# Altium integrated library 兰格封装.IntLib: 1176 symbols (part 1 of 6) (continued)
## GD32F103R (continued)

## GD32F303R
designator U*
LQFP64; 单位: ֻ; 仓库名称: 元件仓; 加工方式: 贴片; 物料名称: GD32F303R; 物料代码: *; 规格型号: *; 助记码: *; 备注: *
footprint LQFP  64
pins: 1 V_BAT, 2 PC13/TAMPER/RTC, 3 PC14/OSC32_IN, 4 PC15/OSC32_OUT, 5 PD0/OSC_IN, 6 PD1/OSC_OUT, 7 NRST, 8 PC0/ADC012_IN10, 9 PC1/ADC012_IN11, 10 PC2/ADC012_IN12, 11 PC3/ADC012_IN13, 12 V_ssa, 13 V_dda, 14 PA0/WKUP/USART1_CTS/ADC012_IN0/TIMER1_CH0_ETI/TIMER4_CH0/TIMER7_ETI, 15 PA1/USART1_RTS/ADC012_IN1/TIMER1_CH1_ETI/TIMER4_CH1, 16 PA2/USART1_TX/ADC012_IN2/TIMER1_CH2/TIMER4_CH2/TIMER8_CH0/SPIO_IO2, 17 PA3/USART1_RX/ADC012_IN3/TIMER1_CH3/TIMER4_CH3/TIMER8_CH1/SPIO_IO3, 18 Vss4, 19 Vdd4, 20 PA4, 21 PA5/SPIO_SCK/ADC01_IN5/DAC_OUT1, 22 PA6/SPI0_MISO/ADC01_IN6/TIMER2_CH0/TIMER7_BKM/TIMER12_CH0/TIMER0_BKIN, 23 PA7/SPIO_MOSI/ADC01_IN7/TIMER2_CH1/TIMER7_CH0_ON/TIMER13_CH0/TIMER0_CH0_ON, 24 PC4/ADC01_IN14, 25 PC5/ADC01_IN15, 26 PB0/ADC01_IN8/TIMER2_CH2/TIMER7_CH1_ON/TIMER0_CH1_ON, 27 PB1/ADC01_IN9/TIMER2_CH3/TIMER7_CH2_ON/TIMER0_CH2_ON, 28 PB2/BOOT1, 29 PB10/I2C1_SCL/USART2_TX/TIMER1_CH2, 30 PB11/I2C1_SDA/USART2_RX/TIMER1_CH3, 31 Vss, 32 Vdd, 33 PB12/SPI1_NSS/I2C1_SMBA/USART2_CK/TIMER0_BKIN/I2S1_WS, 34 PB13/SPI1_SCK/USART2_CTS/TIMER0_CH0_ON/I2C1_CK, 35 PB14/SPI1_MISO/USART2_RTS/TIMER0_CH1_ON/TIMER11_CH0, 36 PB15/SPI1_MOSI/TIMER0_CH2_ON/I2C1_SD/TIMER11_CH1, 37 PC6/I2C1_MCK/TIMER7_CH0/SDIO_D6/TIMER2_CH0, 38 PC7/I2C2_MCK/TIMER7_CH1/SDIO_D7/TIMER2_CH1, 39 PC8/TIMER7_CH2/SDIO_D0/TIMER2_CH2, 40 PC9/TIMER7_CH3/SDIO_D1/TIMER2_CH3, 41 PA8/USART0_CK/TIMER0_CH0/CK_OUT0/VCORE/CTC_SYNC, 42 PA9/USART0_TX/TIMER0_CH1, 43 PA10/USART0_RX/TIMER0_CH2, 44 PA11/USART0_CTS/CAN0_RX/USBDM/TIMER0_CH3, 45 PA12/USART0_RTS/CAN0_TX/TIMER0_ETI/USBDP, 46 PA13/JTMS/SWDIO, 47 Vss_2, 48 Vdd_2, 49 PA14/JTCK/SWCLK, 50 PA15/JTDI/SPI2_NSS/I2S2_WS/TIMER1_CH0_ETI/PA15/SPIO_NSS, 51 PC10/USART3_TX/SDIO_D2/USART2_TX/SPI2_SCK/I2S2_CK, 52 PC11/UART3_RX/SDIO_D3/USART2_RX/SPI2_MISO, 53 PC12/UART4_TX/SDIO_CK, 54 PD2/TIMER2_ETI/SDIO_CMD/UART4_RX, 55 PB3/JTDO/SPI2_SCK/I2S2_CK/TRACESWO/TIMER1_CH1/SPI0_SCK, 56 PB4/NJTRST/SPI2_MISO/TIMER2_CH0/SPI0_MISO, 57 PB5/I2C0_SMBA/SPI2_MOSI/I2S2_SD/TIMER2_CH1/SPI0_MOSI, 58 PB6/I2C0_SCL/TIMER3_CH0/USART0_TX/SPI0_IO2, 59 PB7/I2C0_SDA/TIMER3_CH1/EXMC_NADV/USART0_RX/SPI0_IO3, 60 BOOT0, 61 PB8/TIMER3_CH2/SDIO_D4/TIMER9_CH0/I2C0_SCL/CAN0_RX, 62 PB9/TIMER3_CH3/SDIO_D5/TIMER10_CH0/I2C0_SDA/CAN0_TX, 63 Vss_3, 64 Vdd_3

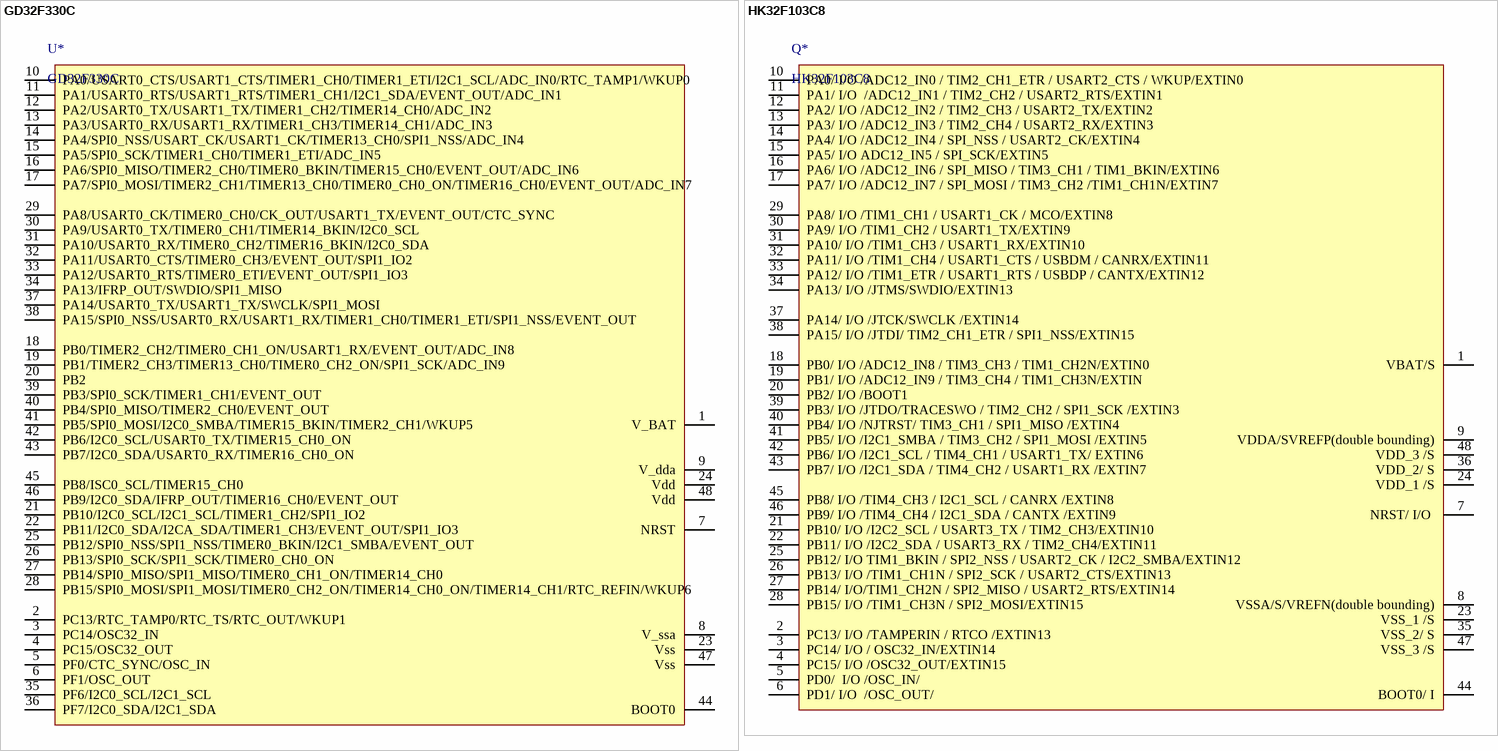
[diagram p4: symbols GD32F330C to HK32F103C8]

## GD32F330C
designator U*
LQFP48; 仓库名称: 元件仓; 单位: ֻ; 加工方式: 贴片; 物料名称: GD32F330C; 物料代码: *; 规格型号: *; 助记码: *; 备注: *
footprint LQFP  48
pins: 1 V_BAT, 2 PC13/RTC_TAMP0/RTC_TS/RTC_OUT/WKUP1, 3 PC14/OSC32_IN, 4 PC15/OSC32_OUT, 5 PF0/CTC_SYNC/OSC_IN, 6 PF1/OSC_OUT, 7 NRST, 8 V_ssa, 9 V_dda, 10 PA0/USART0_CTS/USART1_CTS/TIMER1_CH0/TIMER1_ETI/I2C1_SCL/ADC_IN0/RTC_TAMP1/WKUP0, 11 PA1/USART0_RTS/USART1_RTS/TIMER1_CH1/I2C1_SDA/EVENT_OUT/ADC_IN1, 12 PA2/USART0_TX/USART1_TX/TIMER1_CH2/TIMER14_CH0/ADC_IN2, 13 PA3/USART0_RX/USART1_RX/TIMER1_CH3/TIMER14_CH1/ADC_IN3, 14 PA4/SPI0_NSS/USART_CK/USART1_CK/TIMER13_CH0/SPI1_NSS/ADC_IN4, 15 PA5/SPI0_SCK/TIMER1_CH0/TIMER1_ETI/ADC_IN5, 16 PA6/SPI0_MISO/TIMER2_CH0/TIMER0_BKIN/TIMER15_CH0/EVENT_OUT/ADC_IN6, 17 PA7/SPI0_MOSI/TIMER2_CH1/TIMER13_CH0/TIMER0_CH0_ON/TIMER16_CH0/EVENT_OUT/ADC_IN7, 18 PB0/TIMER2_CH2/TIMER0_CH1_ON/USART1_RX/EVENT_OUT/ADC_IN8, 19 PB1/TIMER2_CH3/TIMER13_CH0/TIMER0_CH2_ON/SPI1_SCK/ADC_IN9, 20 PB2, 21 PB10/I2C0_SCL/I2C1_SCL/TIMER1_CH2/SPI1_IO2, 22 PB11/I2C0_SDA/I2CA_SDA/TIMER1_CH3/EVENT_OUT/SPI1_IO3, 23 Vss, 24 Vdd, 25 PB12/SPI0_NSS/SPI1_NSS/TIMER0_BKIN/I2C1_SMBA/EVENT_OUT, 26 PB13/SPI0_SCK/SPI1_SCK/TIMER0_CH0_ON, 27 PB14/SPI0_MISO/SPI1_MISO/TIMER0_CH1_ON/TIMER14_CH0, 28 PB15/SPI0_MOSI/SPI1_MOSI/TIMER0_CH2_ON/TIMER14_CH0_ON/TIMER14_CH1/RTC_REFIN/WKUP6, 29 PA8/USART0_CK/TIMER0_CH0/CK_OUT/USART1_TX/EVENT_OUT/CTC_SYNC, 30 PA9/USART0_TX/TIMER0_CH1/TIMER14_BKIN/I2C0_SCL, 31 PA10/USART0_RX/TIMER0_CH2/TIMER16_BKIN/I2C0_SDA, 32 PA11/USART0_CTS/TIMER0_CH3/EVENT_OUT/SPI1_IO2, 33 PA12/USART0_RTS/TIMER0_ETI/EVENT_OUT/SPI1_IO3, 34 PA13/IFRP_OUT/SWDIO/SPI1_MISO, 35 PF6/I2C0_SCL/I2C1_SCL, 36 PF7/I2C0_SDA/I2C1_SDA, 37 PA14/USART0_TX/USART1_TX/SWCLK/SPI1_MOSI, 38 PA15/SPI0_NSS/USART0_RX/USART1_RX/TIMER1_CH0/TIMER1_ETI/SPI1_NSS/EVENT_OUT, 39 PB3/SPI0_SCK/TIMER1_CH1/EVENT_OUT, 40 PB4/SPI0_MISO/TIMER2_CH0/EVENT_OUT, 41 PB5/SPI0_MOSI/I2C0_SMBA/TIMER15_BKIN/TIMER2_CH1/WKUP5, 42 PB6/I2C0_SCL/USART0_TX/TIMER15_CH0_ON, 43 PB7/I2C0_SDA/USART0_RX/TIMER16_CH0_ON, 44 BOOT0, 45 PB8/ISC0_SCL/TIMER15_CH0, 46 PB9/I2C0_SDA/IFRP_OUT/TIMER16_CH0/EVENT_OUT, 47 Vss, 48 Vdd

## HK32F103C8
designator Q*
仓库名称: 元件仓; 单位: ֻ; 加工方式: 贴片; 物料名称: HK32F103C8; 物料代码: *; 助记码: *; 备注: *; 规格型号: *
footprint LQFP  48
pins: 1 VBAT/S, 2 PC13/ I/O /TAMPERIN / RTCO /EXTIN13, 3 PC14/ I/O / OSC32_IN/EXTIN14, 4 PC15/ I/O /OSC32_OUT/EXTIN15, 5 PD0/  I/O /OSC_IN/, 6 PD1/ I/O  /OSC_OUT/, 7 NRST/ I/O , 8 VSSA/S/VREFN(double bounding), 9 VDDA/SVREFP(double bounding), 10 PA0/ I/O /ADC12_IN0 / TIM2_CH1_ETR / USART2_CTS / WKUP/EXTIN0, 11 PA1/ I/O  /ADC12_IN1 / TIM2_CH2 / USART2_RTS/EXTIN1, 12 PA2/ I/O /ADC12_IN2 / TIM2_CH3 / USART2_TX/EXTIN2, 13 PA3/ I/O /ADC12_IN3 / TIM2_CH4 / USART2_RX/EXTIN3, 14 PA4/ I/O /ADC12_IN4 / SPI_NSS / USART2_CK/EXTIN4, 15 PA5/ I/O ADC12_IN5 / SPI_SCK/EXTIN5, 16 PA6/ I/O /ADC12_IN6 / SPI_MISO / TIM3_CH1 / TIM1_BKIN/EXTIN6, 17 PA7/ I/O /ADC12_IN7 / SPI_MOSI / TIM3_CH2 /TIM1_CH1N/EXTIN7, 18 PB0/ I/O /ADC12_IN8 / TIM3_CH3 / TIM1_CH2N/EXTIN0, 19 PB1/ I/O /ADC12_IN9 / TIM3_CH4 / TIM1_CH3N/EXTIN, 20 PB2/ I/O /BOOT1, 21 PB10/ I/O /I2C2_SCL / USART3_TX / TIM2_CH3/EXTIN10, 22 PB11/ I/O /I2C2_SDA / USART3_RX / TIM2_CH4/EXTIN11, 23 VSS_1 /S, 24 VDD_1 /S, 25 PB12/ I/O TIM1_BKIN / SPI2_NSS / USART2_CK / I2C2_SMBA/EXTIN12, 26 PB13/ I/O /TIM1_CH1N / SPI2_SCK / USART2_CTS/EXTIN13, 27 PB14/ I/O/TIM1_CH2N / SPI2_MISO / USART2_RTS/EXTIN14, 28 PB15/ I/O /TIM1_CH3N / SPI2_MOSI/EXTIN15, 29 PA8/ I/O /TIM1_CH1 / USART1_CK / MCO/EXTIN8, 30 PA9/ I/O /TIM1_CH2 / USART1_TX/EXTIN9, 31 PA10/ I/O /TIM1_CH3 / USART1_RX/EXTIN10, 32 PA11/ I/O /TIM1_CH4 / USART1_CTS / USBDM / CANRX/EXTIN11, 33 PA12/ I/O /TIM1_ETR / USART1_RTS / USBDP / CANTX/EXTIN12, 34 PA13/ I/O /JTMS/SWDIO/EXTIN13, 35 VSS_2/ S, 36 VDD_2/ S, 37 PA14/ I/O /JTCK/SWCLK /EXTIN14, 38 PA15/ I/O /JTDI/ TIM2_CH1_ETR / SPI1_NSS/EXTIN15, 39 PB3/ I/O /JTDO/TRACESWO / TIM2_CH2 / SPI1_SCK /EXTIN3, 40 PB4/ I/O /NJTRST/ TIM3_CH1 / SPI1_MISO /EXTIN4, 41 PB5/ I/O /I2C1_SMBA / TIM3_CH2 / SPI1_MOSI /EXTIN5, 42 PB6/ I/O /I2C1_SCL / TIM4_CH1 / USART1_TX/ EXTIN6, 43 PB7/ I/O /I2C1_SDA / TIM4_CH2 / USART1_RX /EXTIN7, 44 BOOT0/ I, 45 PB8/ I/O /TIM4_CH3 / I2C1_SCL / CANRX /EXTIN8, 46 PB9/ I/O /TIM4_CH4 / I2C1_SDA / CANTX /EXTIN9, 47  VSS_3 /S, 48 VDD_3 /S

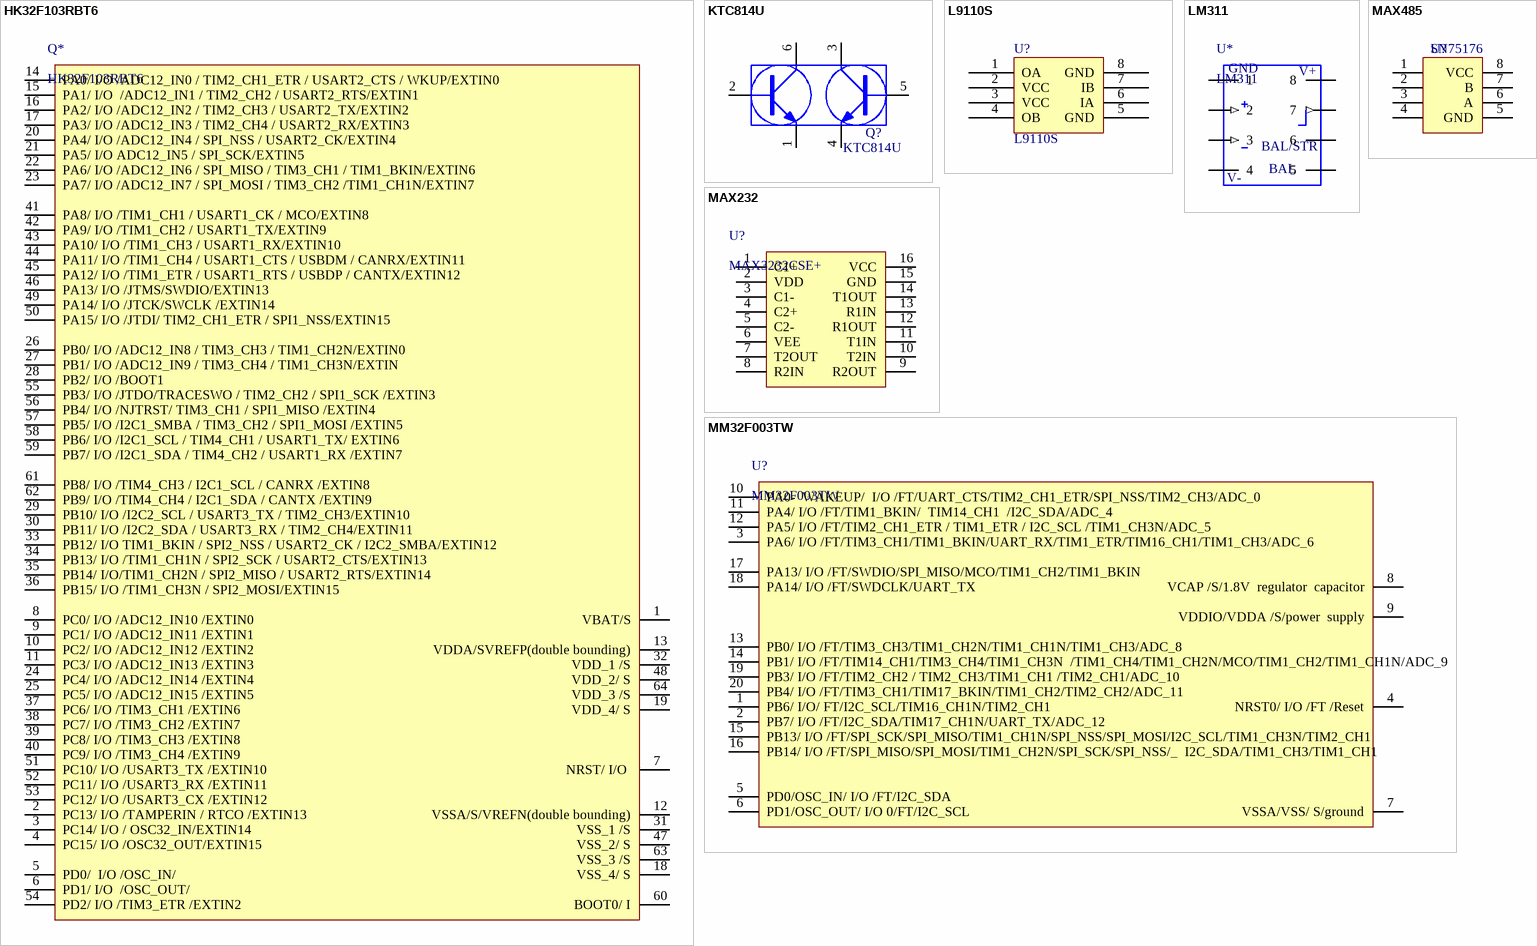
[diagram p5: symbols HK32F103RBT6 to MM32F003TW]

## HK32F103RBT6
designator Q*
单位: ֻ; 加工方式: 贴片; 仓库名称: 元件仓; 物料名称: HK32F103RBT6; 物料代码: *; 规格型号: *; 助记码: *
footprint LQFP  64
pins: 1 VBAT/S, 2 PC13/ I/O /TAMPERIN / RTCO /EXTIN13, 3 PC14/ I/O / OSC32_IN/EXTIN14, 4 PC15/ I/O /OSC32_OUT/EXTIN15, 5 PD0/  I/O /OSC_IN/, 6 PD1/ I/O  /OSC_OUT/, 7 NRST/ I/O , 8 PC0/ I/O /ADC12_IN10 /EXTIN0, 9 PC1/ I/O /ADC12_IN11 /EXTIN1, 10 PC2/ I/O /ADC12_IN12 /EXTIN2, 11 PC3/ I/O /ADC12_IN13 /EXTIN3, 12 VSSA/S/VREFN(double bounding), 13 VDDA/SVREFP(double bounding), 14 PA0/ I/O /ADC12_IN0 / TIM2_CH1_ETR / USART2_CTS / WKUP/EXTIN0, 15 PA1/ I/O  /ADC12_IN1 / TIM2_CH2 / USART2_RTS/EXTIN1, 16 PA2/ I/O /ADC12_IN2 / TIM2_CH3 / USART2_TX/EXTIN2, 17 PA3/ I/O /ADC12_IN3 / TIM2_CH4 / USART2_RX/EXTIN3, 18 VSS_4/ S, 19 VDD_4/ S, 20 PA4/ I/O /ADC12_IN4 / SPI_NSS / USART2_CK/EXTIN4, 21 PA5/ I/O ADC12_IN5 / SPI_SCK/EXTIN5, 22 PA6/ I/O /ADC12_IN6 / SPI_MISO / TIM3_CH1 / TIM1_BKIN/EXTIN6, 23 PA7/ I/O /ADC12_IN7 / SPI_MOSI / TIM3_CH2 /TIM1_CH1N/EXTIN7, 24 PC4/ I/O /ADC12_IN14 /EXTIN4, 25 PC5/ I/O /ADC12_IN15 /EXTIN5, 26 PB0/ I/O /ADC12_IN8 / TIM3_CH3 / TIM1_CH2N/EXTIN0, 27 PB1/ I/O /ADC12_IN9 / TIM3_CH4 / TIM1_CH3N/EXTIN, 28 PB2/ I/O /BOOT1, 29 PB10/ I/O /I2C2_SCL / USART3_TX / TIM2_CH3/EXTIN10, 30 PB11/ I/O /I2C2_SDA / USART3_RX / TIM2_CH4/EXTIN11, 31 VSS_1 /S, 32 VDD_1 /S, 33 PB12/ I/O TIM1_BKIN / SPI2_NSS / USART2_CK / I2C2_SMBA/EXTIN12, 34 PB13/ I/O /TIM1_CH1N / SPI2_SCK / USART2_CTS/EXTIN13, 35 PB14/ I/O/TIM1_CH2N / SPI2_MISO / USART2_RTS/EXTIN14, 36 PB15/ I/O /TIM1_CH3N / SPI2_MOSI/EXTIN15, 37 PC6/ I/O /TIM3_CH1 /EXTIN6, 38 PC7/ I/O /TIM3_CH2 /EXTIN7, 39 PC8/ I/O /TIM3_CH3 /EXTIN8, 40 PC9/ I/O /TIM3_CH4 /EXTIN9, 41 PA8/ I/O /TIM1_CH1 / USART1_CK / MCO/EXTIN8, 42 PA9/ I/O /TIM1_CH2 / USART1_TX/EXTIN9, 43 PA10/ I/O /TIM1_CH3 / USART1_RX/EXTIN10, 44 PA11/ I/O /TIM1_CH4 / USART1_CTS / USBDM / CANRX/EXTIN11, 45 PA12/ I/O /TIM1_ETR / USART1_RTS / USBDP / CANTX/EXTIN12, 46 PA13/ I/O /JTMS/SWDIO/EXTIN13, 47 VSS_2/ S, 48 VDD_2/ S, 49 PA14/ I/O /JTCK/SWCLK /EXTIN14, 50 PA15/ I/O /JTDI/ TIM2_CH1_ETR / SPI1_NSS/EXTIN15, 51 PC10/ I/O /USART3_TX /EXTIN10, 52 PC11/ I/O /USART3_RX /EXTIN11, 53 PC12/ I/O /USART3_CX /EXTIN12, 54 PD2/ I/O /TIM3_ETR /EXTIN2, 55 PB3/ I/O /JTDO/TRACESWO / TIM2_CH2 / SPI1_SCK /EXTIN3, 56 PB4/ I/O /NJTRST/ TIM3_CH1 / SPI1_MISO /EXTIN4, 57 PB5/ I/O /I2C1_SMBA / TIM3_CH2 / SPI1_MOSI /EXTIN5, 58 PB6/ I/O /I2C1_SCL / TIM4_CH1 / USART1_TX/ EXTIN6, 59 PB7/ I/O /I2C1_SDA / TIM4_CH2 / USART1_RX /EXTIN7, 60 BOOT0/ I, 61 PB8/ I/O /TIM4_CH3 / I2C1_SCL / CANRX /EXTIN8, 62 PB9/ I/O /TIM4_CH4 / I2C1_SDA / CANTX /EXTIN9, 63  VSS_3 /S, 64 VDD_3 /S

## KTC814U
designator Q?
仓库名称: 元件仓; 单位: ֻ; 物料名称: *; 物料代码: *; 助记码: *; 规格型号: *; 备注: *; 加工方式: *
footprint DFN-6 (SGM4157)
pins: 1 E, 2 B, 3 C, 4 E, 5 B, 6 C

## L9110S
designator U?
仓库名称: 元件仓; 单位: ֻ; 加工方式: 贴片; 物料代码: *; 物料名称: *; 助记码: *; 规格型号: *; 备注: *
footprint SOP 8
pins: 1 OA, 2 VCC, 3 VCC, 4 OB, 5 GND, 6 IA, 7 IB, 8 GND

## LM311
designator U*
LM311贴片IC; 物料代码: 3.01.04.02.0002; 助记码: LM311TPIC; 仓库名称: 元件仓; 单位: 个; 加工方式: 贴片; 物料名称: LM311贴片IC; 规格型号: *; 备注: *
footprint SOP 8
pins: 1, 2 (in), 3 (in), 4, 5 (hiz), 6 (hiz), 7 (out), 8 (power)
text: GND; V+; BAL/STR; BAL; V-

## MAX232
designator U?, comment MAX3232CSE+
MAX3232CSE+ 贴片IC; 物料代码: 3.01.04.02.0018; 规格型号: SOP-16; 助记码: MAX3232CSE+ TPIC; 仓库名称: 元件仓; 单位: ֻ; 加工方式: 贴片; 物料名称: MAX3232CSE+ 贴片IC
footprint SOP 16
pins: 1 C1+, 2 VDD (power), 3 C1-, 4 C2+, 5 C2-, 6 VEE (power), 7 T2OUT (power), 8 R2IN (oe), 9 R2OUT (oe), 10 T2IN (oe), 11 T1IN (oe), 12 R1OUT (oe), 13 R1IN (oe), 14 T1OUT (oe), 15 GND (power), 16 VCC (power)

## MAX485
designator U?, comment SN75176
SN75176BDR 贴片IC; 物料代码: 3.01.04.02.0071; 仓库名称: 元件仓; 助记码: SN75176BDR TPIC; 单位: ֻ; 规格型号: SOP-8; 加工方式: 贴片; 物料名称: SN75176BDR 贴片IC; 备注: *
footprint SOP 8
pins: 1, 2, 3, 4, 5 GND, 6 A, 7 B, 8 VCC

## MM32F003TW
designator U?
单位: ֻ; 仓库名称: 元件仓; 加工方式: 贴片; 物料名称: MM32F003TW; 物料代码: *; 规格型号: *; 助记码: *; 备注: *
footprint TSSOP 20
pins: 1 PB6/ I/O/ FT/I2C_SCL/TIM16_CH1N/TIM2_CH1, 2 PB7/ I/O /FT/I2C_SDA/TIM17_CH1N/UART_TX/ADC_12, 3 PA6/ I/O /FT/TIM3_CH1/TIM1_BKIN/UART_RX/TIM1_ETR/TIM16_CH1/TIM1_CH3/ADC_6, 4 NRST0/ I/O /FT /Reset, 5 PD0/OSC_IN/ I/O /FT/I2C_SDA, 6 PD1/OSC_OUT/ I/O 0/FT/I2C_SCL, 7 VSSA/VSS/ S/ground, 8 VCAP /S/1.8V  regulator  capacitor, 9 VDDIO/VDDA /S/power  supply, 10 PA0-  WAKEUP/  I/O /FT/UART_CTS/TIM2_CH1_ETR/SPI_NSS/TIM2_CH3/ADC_0, 11 PA4/ I/O /FT/TIM1_BKIN/  TIM14_CH1  /I2C_SDA/ADC_4, 12 PA5/ I/O /FT/TIM2_CH1_ETR / TIM1_ETR / I2C_SCL /TIM1_CH3N/ADC_5, 13 PB0/ I/O /FT/TIM3_CH3/TIM1_CH2N/TIM1_CH1N/TIM1_CH3/ADC_8, 14 PB1/ I/O /FT/TIM14_CH1/TIM3_CH4/TIM1_CH3N  /TIM1_CH4/TIM1_CH2N/MCO/TIM1_CH2/TIM1_CH1N/ADC_9, 15 PB13/ I/O /FT/SPI_SCK/SPI_MISO/TIM1_CH1N/SPI_NSS/SPI_MOSI/I2C_SCL/TIM1_CH3N/TIM2_CH1, 16 PB14/ I/O /FT/SPI_MISO/SPI_MOSI/TIM1_CH2N/SPI_SCK/SPI_NSS/_  I2C_SDA/TIM1_CH3/TIM1_CH1, 17 PA13/ I/O /FT/SWDIO/SPI_MISO/MCO/TIM1_CH2/TIM1_BKIN, 18 PA14/ I/O /FT/SWDCLK/UART_TX, 19 PB3/ I/O /FT/TIM2_CH2 / TIM2_CH3/TIM1_CH1 /TIM2_CH1/ADC_10, 20 PB4/ I/O /FT/TIM3_CH1/TIM17_BKIN/TIM1_CH2/TIM2_CH2/ADC_11

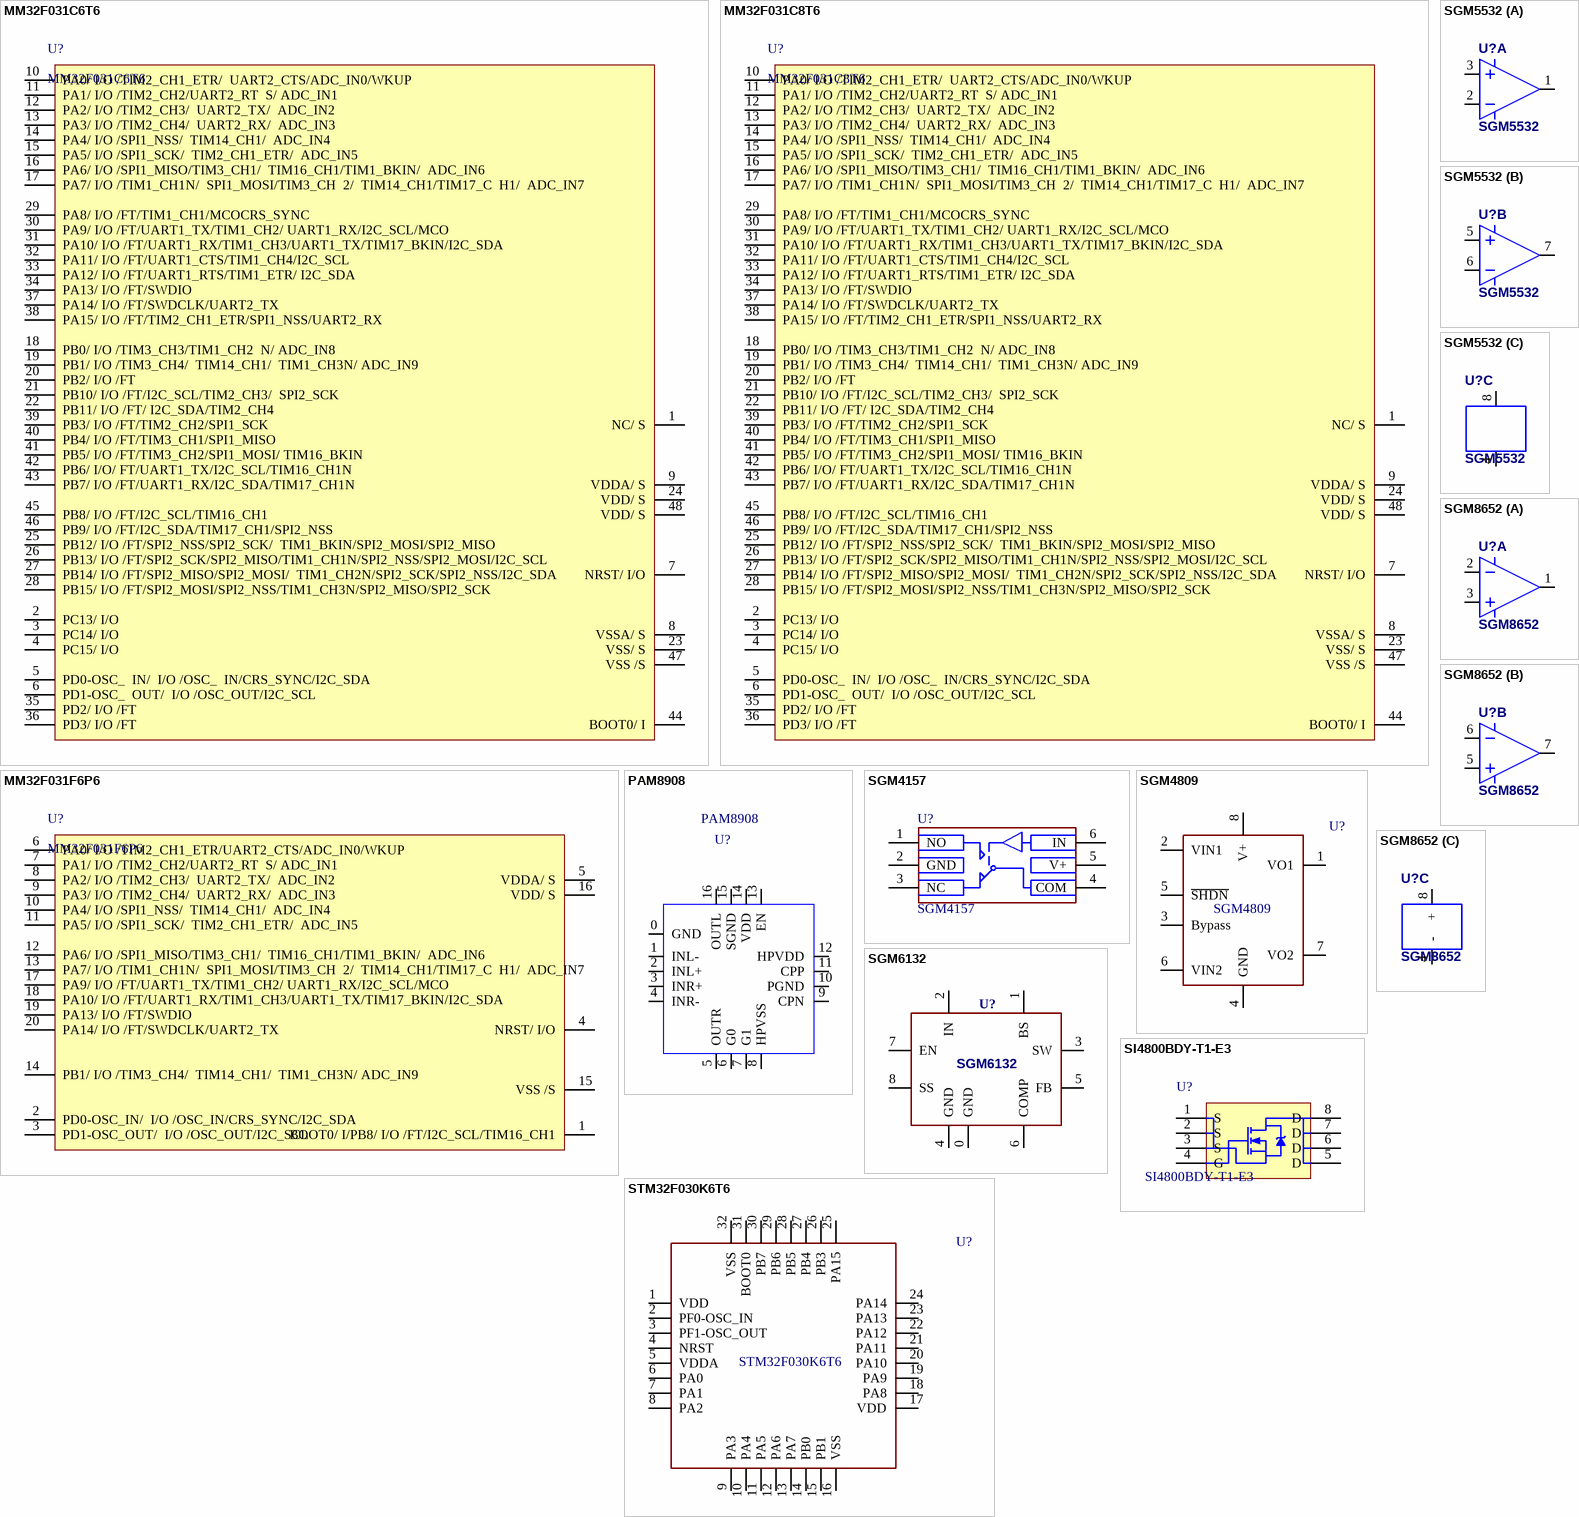
[diagram p6: symbols MM32F031C6T6 to STM32F030K6T6]

## MM32F031C6T6
designator U?
仓库名称: 元件仓; 单位: ֻ; 加工方式: 贴片; 物料名称: MM32F031C6T6; 物料代码: *; 规格型号: *; 助记码: *
footprint LQFP  48
pins: 1 NC/ S, 2 PC13/ I/O, 3 PC14/ I/O, 4 PC15/ I/O, 5 PD0-OSC_  IN/  I/O /OSC_  IN/CRS_SYNC/I2C_SDA, 6 PD1-OSC_  OUT/  I/O /OSC_OUT/I2C_SCL , 7 NRST/ I/O, 8 VSSA/ S, 9 VDDA/ S, 10 PA0/ I/O /TIM2_CH1_ETR/  UART2_CTS/ADC_IN0/WKUP, 11 PA1/ I/O /TIM2_CH2/UART2_RT  S/ ADC_IN1, 12 PA2/ I/O /TIM2_CH3/  UART2_TX/  ADC_IN2, 13 PA3/ I/O /TIM2_CH4/  UART2_RX/  ADC_IN3, 14 PA4/ I/O /SPI1_NSS/  TIM14_CH1/  ADC_IN4, 15 PA5/ I/O /SPI1_SCK/  TIM2_CH1_ETR/  ADC_IN5, 16 PA6/ I/O /SPI1_MISO/TIM3_CH1/  TIM16_CH1/TIM1_BKIN/  ADC_IN6, 17 PA7/ I/O /TIM1_CH1N/  SPI1_MOSI/TIM3_CH  2/  TIM14_CH1/TIM17_C  H1/  ADC_IN7, 18 PB0/ I/O /TIM3_CH3/TIM1_CH2  N/ ADC_IN8, 19 PB1/ I/O /TIM3_CH4/  TIM14_CH1/  TIM1_CH3N/ ADC_IN9, 20 PB2/ I/O /FT, 21 PB10/ I/O /FT/I2C_SCL/TIM2_CH3/  SPI2_SCK, 22 PB11/ I/O /FT/ I2C_SDA/TIM2_CH4, 23 VSS/ S, 24 VDD/ S, 25 PB12/ I/O /FT/SPI2_NSS/SPI2_SCK/  TIM1_BKIN/SPI2_MOSI/SPI2_MISO, 26 PB13/ I/O /FT/SPI2_SCK/SPI2_MISO/TIM1_CH1N/SPI2_NSS/SPI2_MOSI/I2C_SCL, 27 PB14/ I/O /FT/SPI2_MISO/SPI2_MOSI/  TIM1_CH2N/SPI2_SCK/SPI2_NSS/I2C_SDA, 28 PB15/ I/O /FT/SPI2_MOSI/SPI2_NSS/TIM1_CH3N/SPI2_MISO/SPI2_SCK, 29 PA8/ I/O /FT/TIM1_CH1/MCOCRS_SYNC, 30 PA9/ I/O /FT/UART1_TX/TIM1_CH2/ UART1_RX/I2C_SCL/MCO, 31 PA10/ I/O /FT/UART1_RX/TIM1_CH3/UART1_TX/TIM17_BKIN/I2C_SDA, 32 PA11/ I/O /FT/UART1_CTS/TIM1_CH4/I2C_SCL, 33 PA12/ I/O /FT/UART1_RTS/TIM1_ETR/ I2C_SDA, 34 PA13/ I/O /FT/SWDIO, 35 PD2/ I/O /FT, 36 PD3/ I/O /FT, 37 PA14/ I/O /FT/SWDCLK/UART2_TX, 38 PA15/ I/O /FT/TIM2_CH1_ETR/SPI1_NSS/UART2_RX, 39 PB3/ I/O /FT/TIM2_CH2/SPI1_SCK, 40 PB4/ I/O /FT/TIM3_CH1/SPI1_MISO, 41 PB5/ I/O /FT/TIM3_CH2/SPI1_MOSI/ TIM16_BKIN, 42 PB6/ I/O/ FT/UART1_TX/I2C_SCL/TIM16_CH1N, 43 PB7/ I/O /FT/UART1_RX/I2C_SDA/TIM17_CH1N, 44 BOOT0/ I, 45 PB8/ I/O /FT/I2C_SCL/TIM16_CH1, 46 PB9/ I/O /FT/I2C_SDA/TIM17_CH1/SPI2_NSS, 47 VSS /S, 48 VDD/ S

## MM32F031C8T6
designator U?
单位: ֻ; 仓库名称: 元件仓; 加工方式: 贴片; 物料名称: MM32F031C8T6
footprint LQFP  48
pins: 1 NC/ S, 2 PC13/ I/O, 3 PC14/ I/O, 4 PC15/ I/O, 5 PD0-OSC_  IN/  I/O /OSC_  IN/CRS_SYNC/I2C_SDA, 6 PD1-OSC_  OUT/  I/O /OSC_OUT/I2C_SCL , 7 NRST/ I/O, 8 VSSA/ S, 9 VDDA/ S, 10 PA0/ I/O /TIM2_CH1_ETR/  UART2_CTS/ADC_IN0/WKUP, 11 PA1/ I/O /TIM2_CH2/UART2_RT  S/ ADC_IN1, 12 PA2/ I/O /TIM2_CH3/  UART2_TX/  ADC_IN2, 13 PA3/ I/O /TIM2_CH4/  UART2_RX/  ADC_IN3, 14 PA4/ I/O /SPI1_NSS/  TIM14_CH1/  ADC_IN4, 15 PA5/ I/O /SPI1_SCK/  TIM2_CH1_ETR/  ADC_IN5, 16 PA6/ I/O /SPI1_MISO/TIM3_CH1/  TIM16_CH1/TIM1_BKIN/  ADC_IN6, 17 PA7/ I/O /TIM1_CH1N/  SPI1_MOSI/TIM3_CH  2/  TIM14_CH1/TIM17_C  H1/  ADC_IN7, 18 PB0/ I/O /TIM3_CH3/TIM1_CH2  N/ ADC_IN8, 19 PB1/ I/O /TIM3_CH4/  TIM14_CH1/  TIM1_CH3N/ ADC_IN9, 20 PB2/ I/O /FT, 21 PB10/ I/O /FT/I2C_SCL/TIM2_CH3/  SPI2_SCK, 22 PB11/ I/O /FT/ I2C_SDA/TIM2_CH4, 23 VSS/ S, 24 VDD/ S, 25 PB12/ I/O /FT/SPI2_NSS/SPI2_SCK/  TIM1_BKIN/SPI2_MOSI/SPI2_MISO, 26 PB13/ I/O /FT/SPI2_SCK/SPI2_MISO/TIM1_CH1N/SPI2_NSS/SPI2_MOSI/I2C_SCL, 27 PB14/ I/O /FT/SPI2_MISO/SPI2_MOSI/  TIM1_CH2N/SPI2_SCK/SPI2_NSS/I2C_SDA, 28 PB15/ I/O /FT/SPI2_MOSI/SPI2_NSS/TIM1_CH3N/SPI2_MISO/SPI2_SCK, 29 PA8/ I/O /FT/TIM1_CH1/MCOCRS_SYNC, 30 PA9/ I/O /FT/UART1_TX/TIM1_CH2/ UART1_RX/I2C_SCL/MCO, 31 PA10/ I/O /FT/UART1_RX/TIM1_CH3/UART1_TX/TIM17_BKIN/I2C_SDA, 32 PA11/ I/O /FT/UART1_CTS/TIM1_CH4/I2C_SCL, 33 PA12/ I/O /FT/UART1_RTS/TIM1_ETR/ I2C_SDA, 34 PA13/ I/O /FT/SWDIO, 35 PD2/ I/O /FT, 36 PD3/ I/O /FT, 37 PA14/ I/O /FT/SWDCLK/UART2_TX, 38 PA15/ I/O /FT/TIM2_CH1_ETR/SPI1_NSS/UART2_RX, 39 PB3/ I/O /FT/TIM2_CH2/SPI1_SCK, 40 PB4/ I/O /FT/TIM3_CH1/SPI1_MISO, 41 PB5/ I/O /FT/TIM3_CH2/SPI1_MOSI/ TIM16_BKIN, 42 PB6/ I/O/ FT/UART1_TX/I2C_SCL/TIM16_CH1N, 43 PB7/ I/O /FT/UART1_RX/I2C_SDA/TIM17_CH1N, 44 BOOT0/ I, 45 PB8/ I/O /FT/I2C_SCL/TIM16_CH1, 46 PB9/ I/O /FT/I2C_SDA/TIM17_CH1/SPI2_NSS, 47 VSS /S, 48 VDD/ S

## MM32F031F6P6
designator U?
仓库名称: 元件仓; 单位: ֻ; 加工方式: 贴片; 物料名称: MM32F031F6P6
footprint TSSOP 20
pins: 1 BOOT0/ I/PB8/ I/O /FT/I2C_SCL/TIM16_CH1, 2 PD0-OSC_IN/  I/O /OSC_IN/CRS_SYNC/I2C_SDA, 3 PD1-OSC_OUT/  I/O /OSC_OUT/I2C_SCL , 4 NRST/ I/O, 5 VDDA/ S, 6 PA0/ I/O /TIM2_CH1_ETR/UART2_CTS/ADC_IN0/WKUP, 7 PA1/ I/O /TIM2_CH2/UART2_RT  S/ ADC_IN1, 8 PA2/ I/O /TIM2_CH3/  UART2_TX/  ADC_IN2, 9 PA3/ I/O /TIM2_CH4/  UART2_RX/  ADC_IN3, 10 PA4/ I/O /SPI1_NSS/  TIM14_CH1/  ADC_IN4, 11 PA5/ I/O /SPI1_SCK/  TIM2_CH1_ETR/  ADC_IN5, 12 PA6/ I/O /SPI1_MISO/TIM3_CH1/  TIM16_CH1/TIM1_BKIN/  ADC_IN6, 13 PA7/ I/O /TIM1_CH1N/  SPI1_MOSI/TIM3_CH  2/  TIM14_CH1/TIM17_C  H1/  ADC_IN7, 14 PB1/ I/O /TIM3_CH4/  TIM14_CH1/  TIM1_CH3N/ ADC_IN9, 15 VSS /S, 16 VDD/ S, 17 PA9/ I/O /FT/UART1_TX/TIM1_CH2/ UART1_RX/I2C_SCL/MCO, 18 PA10/ I/O /FT/UART1_RX/TIM1_CH3/UART1_TX/TIM17_BKIN/I2C_SDA, 19 PA13/ I/O /FT/SWDIO, 20 PA14/ I/O /FT/SWDCLK/UART2_TX

## PAM8908
designator U?
仓库名称: 元件仓; 单位: ֻ; 加工方式: 贴片; 物料名称: *; 物料代码: *; 助记码: *; 规格型号: *; 备注: *
footprint TQFN 16
pins: 0 GND, 1 INL-, 2 INL+, 3 INR+, 4 INR-, 5 OUTR, 6 G0, 7 G1, 8 HPVSS, 9 CPN, 10 PGND, 11 CPP, 12 HPVDD, 13 EN, 14 VDD, 15 SGND, 16 OUTL

## SGM4157
designator U?
加工方式: 贴片; 物料名称: *; 物料代码: *; 助记码: *; 规格型号: *; 仓库名称: *; 单位: *
footprint DFN-6 (SGM4157)
pins: 1 NO, 2 GND, 3 NC, 4 COM, 5 V+, 6 IN

## SGM4809
designator U?
MSOP-8; 仓库名称: 元件仓; 单位: ֻ; 加工方式: 贴片; 物料名称: *; 物料代码: *; 助记码: *; 规格型号: *; 备注: *
footprint MSOP-8 (SGM4809)
pins: 1 VO1, 2 VIN1, 3 Bypass, 4 GND, 5 ~{SHDN}, 6 VIN2, 7 VO2, 8 V+

## SGM5532
designator U?
SGM5532YS8G/TR贴片IC; 物料代码: 3.01.04.02.0083; 助记码: SGM5532YS8G/TRTPIC; 规格型号: SOP8; 仓库名称: 元件仓; 单位: ֻ; 加工方式: 贴片; 物料名称: SGM5532YS8G/TR贴片IC; 备注: *
footprint SOP 8
part A pins: 1, 2, 3
part B pins: 5, 6, 7
part C pins: 4, 8

## SGM6132
designator U?